# Altium footprint library PcbLib.PcbLib: 65 footprints (part 4 of 5)
Each footprint in its own frame and in the unit in brackets; x right, y up, seen from the top. Pads: shape width x height; smd on the part's side, far side on the other; paste and mask are expansions set on the pad; w line width, h text height; cw(c..) or ccw(c..) is an arc to the next point about the centre after c.
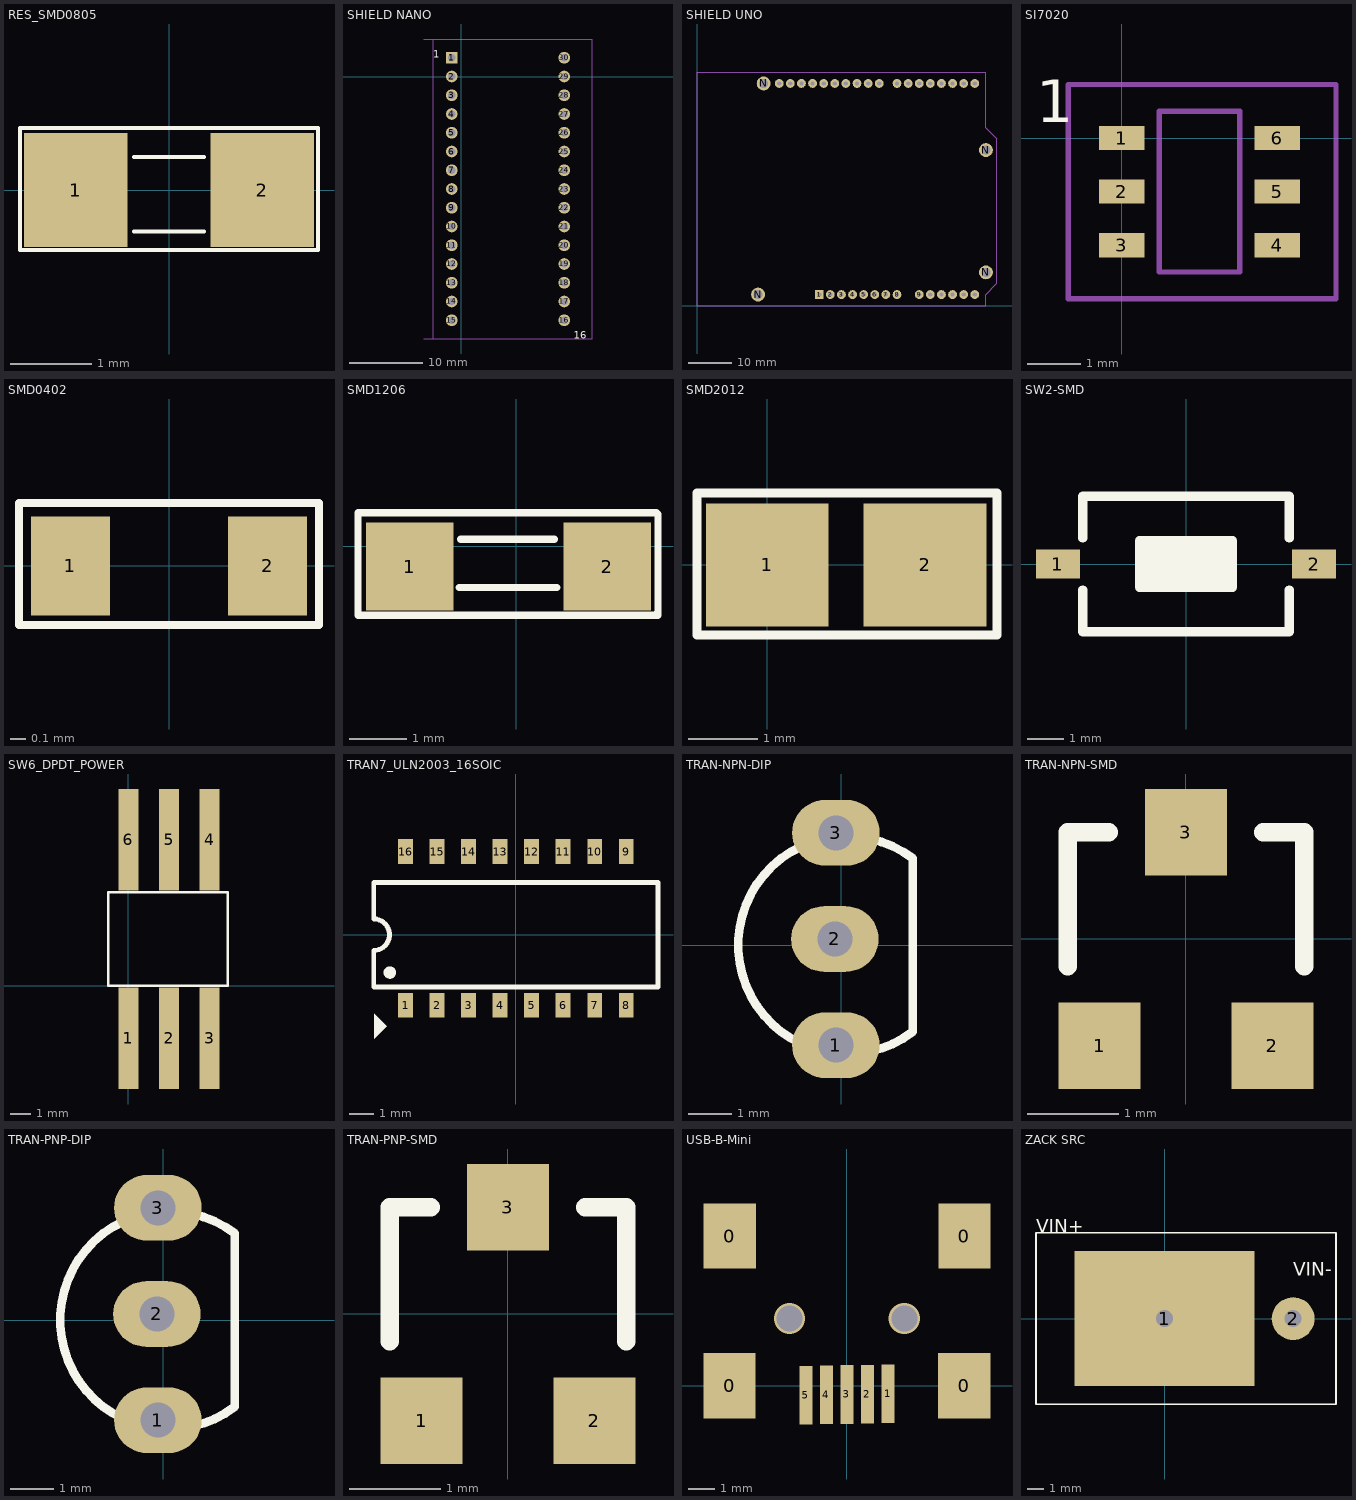
[diagram p3: the footprints below, top view; thin cyan lines are the x and y axes]

## RES_SMD0805 [mil] "Compoment SMD 80x50mil"
height 50
pads (2):
  rect 50x55 smd: 1(-45,0) 2(45,0)
Top Overlay:
  lines w2: -17,-20 17,-20 ; -17,16 17,16 ; -72,-29 72,-29 72,30 -72,30 -72,-29
3D body "SW3dPS-smt_resistor_packages.STEP": height 24.02, standoff -0.39, extent -39.76,-27 39.77,23

## SHIELD NANO [mm]
pads (30):
  rect 1.6x1.6 hole 1: 1(-1.27,2.54)
  round 1.6 hole 1: 2(-1.27,0) 3(-1.27,-2.54) 4(-1.27,-5.08) 5(-1.27,-7.62) 6(-1.27,-10.16) 7(-1.27,-12.7) 8(-1.27,-15.24) 9(-1.27,-17.78) 10(-1.27,-20.32) 11(-1.27,-22.86) 12(-1.27,-25.4) 13(-1.27,-27.94) 14(-1.27,-30.48) 15(-1.27,-33.02) 16(13.97,-33.02) 17(13.97,-30.48) 18(13.97,-27.94) 19(13.97,-25.4) 20(13.97,-22.86) 21(13.97,-20.32) 22(13.97,-17.78) 23(13.97,-15.24) 24(13.97,-12.7) 25(13.97,-10.16) 26(13.97,-7.62) 27(13.97,-5.08) 28(13.97,-2.54) 29(13.97,0) 30(13.97,2.54)
Top Overlay:
  text "1" at -3.81,2.54 h1
  text "16" at 15.24,-35.56 h1
Mechanical 1:
  lines w0.1: -5.08,-35.56 17.78,-35.56 17.78,5.08 -5.08,5.08 ; -3.81,-35.56 -3.81,5.08
3D body "User Library-arduino_nano.STEP": height 15.1, standoff -3.5, extent -2.54,-36.724 15.46,8.276

## SHIELD UNO [mm]
pads (36):
  rect 2x2 hole 1: 1(27.94,2.54)
  round 2 hole 1: 2(30.48,2.54) 3(33.02,2.54) 4(35.56,2.54) 5(38.1,2.54) 6(40.64,2.54) 7(43.18,2.54) 8(45.72,2.54) 9(50.8,2.54) 10(53.34,2.54) 11(55.88,2.54) 12(58.42,2.54) 13(60.96,2.54) 14(63.5,2.54) 15(63.5,50.8) 16(60.96,50.8) 17(58.42,50.8) 18(55.88,50.8) 19(53.34,50.8) 20(50.8,50.8) 21(48.26,50.8) 22(45.72,50.8) 23(41.656,50.8) 24(39.116,50.8) 25(36.576,50.8) 26(34.036,50.8) 27(31.496,50.8) 28(28.956,50.8) 29(26.416,50.8) 30(23.876,50.8) 31(21.336,50.8) 32(18.796,50.8)
  round 3.175 hole 2.032: N(13.97,2.54) N(15.24,50.8) N(66.04,7.62) N(66.04,35.56)
Mechanical 1:
  lines w0.254: 0,0 66.04,0 66.04,2.54 68.58,5.08 68.58,38.1 66.04,40.64 66.04,50.8 66.04,53.34 0,53.34 0,2.54 0,0
3D body "User Library-arduino_uno.STEP": height 1.05, standoff -14.2, extent -5.969,-0.254 68.961,53.086

## SI7020 [mm] "DFN, 4-Leads, Body 3.00x3.00mm, Pitch 0.65mm, IPC Medium Density"
height 0.8
pads (6):
  rect 0.85x0.45 smd: 1(0,0) 2(0,-1) 3(0,-2) 4(2.9,-2) 5(2.9,-1) 6(2.9,0)
Top Overlay:
  text "1" at -1.6,0.3 h0.8
Mechanical 1:
  lines w0.1: 2.2,-2.3 2.2,-2.5 0.7,-2.5 0.7,0.5 2.2,0.5 ; -1,-3 -1,1 4,1 4,-3 -1,-3
Mechanical 13:
  lines w0.1: 2.2,-2.3 2.2,0.5

## SMD0402 [mil]
pads (2):
  rect 20x25 smd: 1(-25,0) 2(25,0)
Top Overlay:
  lines w2: -38,-15 -38,16 38,16 38,-15 -38,-15
3D body "User Library-Chip Resistor_0402 (1005).STEP": height 14.37, standoff 0, extent -19.68,-9.76 19.68,10

## SMD1206 [mil]
pads (2):
  rect 60x60 smd: 1(-72.68,-13.74) 2(62.32,-13.74)
Top Overlay:
  lines w5: -39,-28 28,-28 ; -38,5 26,5 ; 96,-46 97,-47 ; 96,23 -108,23 -108,-47 97,-47 ; 97,22 97,-47
3D body "SW3DPS-RESISTOR 1206-DEFAULT.STEP": height 20.87, standoff -1.18, extent -68.99,-45.67 57,19.68

## SMD2012 [mil]
pads (2):
  rect 70x70 smd: 1(0,0) 2(90,0)
Top Overlay:
  lines w5: -40,-40 131,-40 131,41 -40,41 -40,-40
3D body "User Library-CAPC2012X___.STEP": height 22.44, standoff 0, extent 10.64,-24.99 89.38,25

## SW2-SMD [mm] "Switch SMD type"
pads (2):
  rect 1.2x0.8 smd: 1(-3.5,0) 2(3.5,0)
Top Overlay:
  rectangle: -1.27,-0.635 1.27,0.635
  lines w0.254: -2.819,-0.711 -2.819,-1.854 2.819,-1.854 2.819,-0.711 ; -2.819,0.711 -2.819,1.854 2.819,1.854 2.819,0.711 ; -1.27,-0.635 1.27,-0.635 1.27,0.635 -1.27,0.635 -1.27,-0.635
3D body "User Library-Button-SMD.step": height 2.5, standoff 0, extent -3.05,-1.85 3.05,1.85

## SW6_DPDT_POWER [mm] "PUSH POWER SOURCE"
pads (6):
  rect 1x5 smd: 1(0,-2.6) 2(2,-2.6) 3(4,-2.6) 4(4,7.2) 5(2,7.2) 6(0,7.2)
Top Overlay:
  lines w0.13: 4.9,4.6 -1,4.6 -1,0 4.9,0 4.9,4.6 ; 4.9,4.6 4.9,4.6
3D body "User Library-PVB6_EE.step": height 12.5, standoff -1, extent -3.05,-3.85 6.85,8.65

## TRAN7_ULN2003_16SOIC [mm] "Small Outline; 16 Leads; Body Width 5.6 mm; Pitch 1.27 mm"
height 2
pads (16):
  rect 0.6x1 smd: 1(-4.445,-2.838) 2(-3.175,-2.838) 3(-1.905,-2.838) 4(-0.635,-2.838) 5(0.635,-2.838) 6(1.905,-2.838) 7(3.175,-2.838) 8(4.445,-2.838) 9(4.445,3.346) 10(3.175,3.346) 11(1.905,3.346) 12(0.635,3.346) 13(-0.635,3.346) 14(-1.905,3.346) 15(-3.175,3.346) 16(-4.445,3.346)
Top Overlay:
  circle w0.25: c-5.078,-1.524 r0.125
  region: -5.715,-4.191 -5.207,-3.683 -5.715,-3.175
  lines w0.2: -5.725,-2.1 5.725,-2.1 5.725,2.1 -5.725,2.1 -5.725,0.635 cw(c-5.725,0) -5.725,-0.635 -5.725,-2.1
3D body "User Library-SOIC-16-1.step": height 1.4, standoff 0, extent -4.95,-2.746 4.95,3.254

## TRAN-NPN-DIP [mm] "TO, Flat Index; 3 In-Line, Axial Leads; Body Dia. 4.5mm; Leads 0.51 x 0.48 mm (max)"
height 6.86
pads (3):
  oval 2x1.5 hole 0.8: 1(-0.127,-2.286) 2(-0.151,0.139) 3(-0.127,2.564)
Top Overlay:
  lines w0.2: 1.627,-1.98 cw(c0.127,0) 1.627,1.98 1.627,-1.98
3D body "BJT.step": height 11, standoff -1, extent -2.476,-2.794 1.524,3.006

## TRAN-NPN-SMD [mm] "SOT-23; 3 Leads; Body 3.0 x 2.5 mm, inc. leads (LxW max)"
height 1.2
pads (3):
  rect 0.9x0.95 smd: 1(-0.95,-1.175) 2(0.95,-1.175) 3(0,1.175)
Top Overlay:
  lines w0.2: -1.3,-0.3 -1.3,1.175 -0.85,1.175 ; 0.85,1.175 1.3,1.175 1.3,-0.3
3D body "CircuitWorks-SOT-23.step": height 1.06, standoff -0.04, extent -1.5,-1.439 1.5,1.061

## TRAN-PNP-DIP [mm] "TO, Flat Index; 3 In-Line, Axial Leads; Body Dia. 4.5mm; Leads 0.51 x 0.48 mm (max)"
height 6.86
pads (3):
  oval 2x1.5 hole 0.8: 1(-0.127,-2.286) 2(-0.151,0.139) 3(-0.127,2.564)
Top Overlay:
  lines w0.2: 1.627,-1.98 cw(c0.127,0) 1.627,1.98 1.627,-1.98
3D body "BJT.step": height 11, standoff -1, extent -2.476,-2.794 1.524,3.006

## TRAN-PNP-SMD [mm] "SOT-23; 3 Leads; Body 3.0 x 2.5 mm, inc. leads (LxW max)"
height 1.2
pads (3):
  rect 0.9x0.95 smd: 1(-0.95,-1.175) 2(0.95,-1.175) 3(0,1.175)
Top Overlay:
  lines w0.2: -1.3,-0.3 -1.3,1.175 -0.85,1.175 ; 0.85,1.175 1.3,1.175 1.3,-0.3
3D body "CircuitWorks-SOT-23.step": height 1.06, standoff -0.04, extent -1.5,-1.377 1.5,1.123

## USB-B-Mini [mm]
pads (9):
  rect 2x2.5 smd: 0(-4.5,0) 0(-4.496,5.74) 0(4.5,0) 0(4.504,5.74)
  rect 0.5x2.25 smd: 1(1.575,-0.305) 2(0.787,-0.318) 3(0,-0.33) 4(-0.787,-0.343) 5(-1.575,-0.356)
via -2.2,2.58 diameter 1.2 hole 1
via 2.2,2.58 diameter 1.2 hole 1
3D body "User Library-USB_mini_B.step": height 3.95, standoff -1, extent -5.35,-0.673 5.35,8.527

## ZACK SRC [mm] "HEADER, SINGLE, DISTANCE = 100mil"
pads (2):
  rect 10.668x8.001 hole 1: 1(0,0)
  round 2.54 hole 1: 2(7.62,0)
Top Overlay:
  lines w0.1: -7.62,-5.08 -7.62,5.08 10.16,5.08 10.16,-5.08 -7.62,-5.08
  lines w0.254: -1.778,-1.905 5.08,-1.905 5.08,1.778 -1.778,1.778 -1.778,-1.905
  text "VIN+" at -7.62,5.08 h0.8
  text "VIN-" at 7.62,2.54 h0.8